# Altium footprint library TarabusLibrary.PcbLib: 591 footprints (part 9 of 37)
Each footprint in its own frame and in the unit in brackets; x right, y up, seen from the top. Pads: shape width x height; smd on the part's side, far side on the other; paste and mask are expansions set on the pad; w line width, h text height; cw(c..) or ccw(c..) is an arc to the next point about the centre after c.
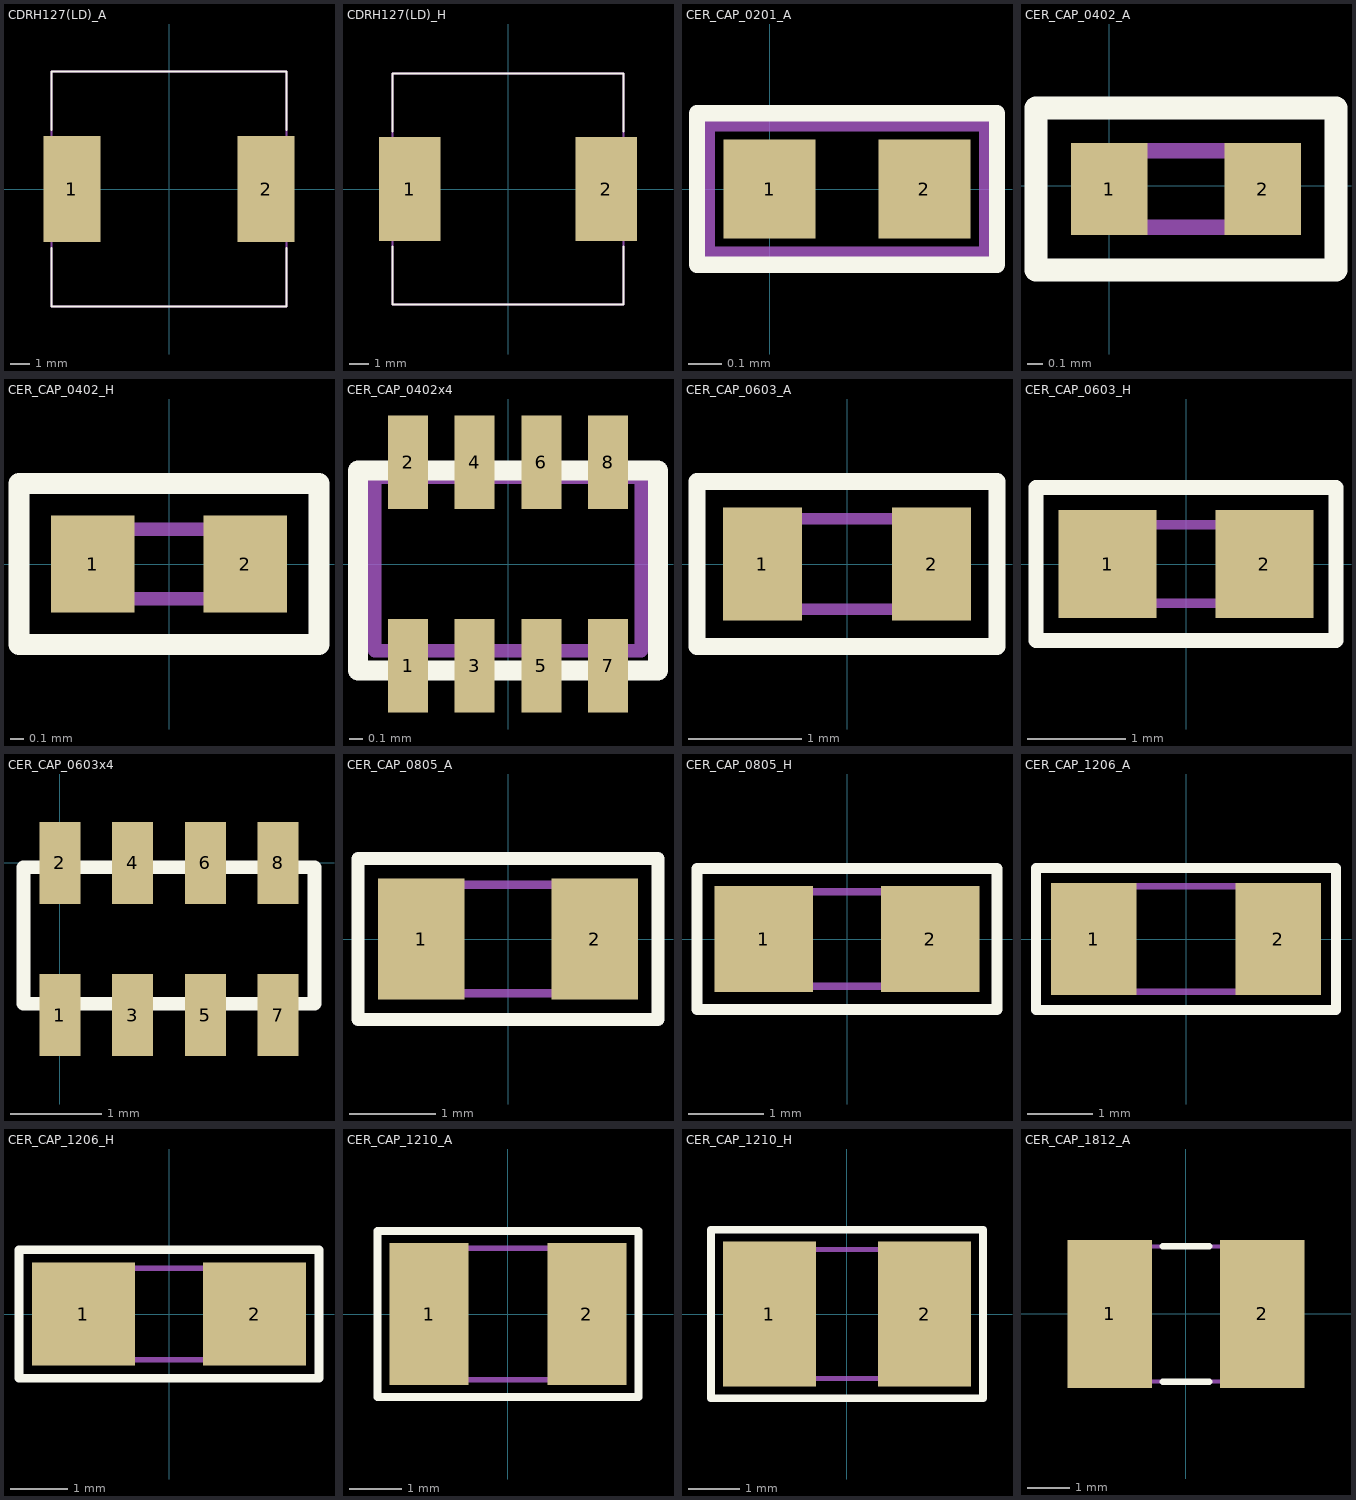
[diagram p8: the footprints below, top view; thin cyan lines are the x and y axes]

## CDRH127(LD)_A [mm]
height 8
pads (2):
  rect 2.9x5.4 smd mask+0: 1(-4.95,0) 2(4.95,0)
Top Overlay:
  lines w0.1: -6,-3 -6,-6 6,-6 6,-3 ; -6,3 -6,6 6,6 6,3
Mechanical 7:
  lines w0.1: -6,-6 -6,4.5 -6,6 6,6 6,-1.5 6,-6 -6,-6
Mechanical 10:
  text ".Comment" at -2,-7 h0.6
  text ".Designator" at 0,7 h0.8
3D body: height 2.8, standoff 0, extent -6,-6 6,6

## CDRH127(LD)_H [mm]
height 8
pads (2):
  rect 3.2x5.4 smd mask+0: 1(-5.1,0) 2(5.1,0)
Top Overlay:
  lines w0.1: -6,-3 -6,-6 6,-6 6,-3 ; -6,3 -6,6 6,6 6,3
Mechanical 7:
  lines w0.1: -6,-6 -6,4.5 -6,6 6,6 6,-1.5 6,-6 -6,-6
Mechanical 10:
  text ".Comment" at -2,-7 h0.6
  text ".Designator" at 0,7 h0.8
3D body: height 2.8, standoff 0, extent -6,-6 6,6

## CER_CAP_0201_A [mm]
pads (2):
  rect 0.28x0.3 smd mask+0.05: 1(0,0) 2(0.47,0)
Top Overlay:
  lines w0.05: -0.22,-0.23 -0.22,0.23 0.69,0.23 0.69,-0.23 -0.22,-0.23
Mechanical 7:
  lines w0.05: -0.19,-0.2 0.66,-0.2 0.66,0.2 -0.19,0.2 -0.19,-0.2
Mechanical 10:
  text ".Comment" at -0.08,-1.13 h0.6
  text ".Designator" at -0.08,0.73 h0.8
3D body: height 0.23, standoff 0, extent -0.06,-0.15 0.53,0.15

## CER_CAP_0402_A [mm]
pads (2):
  rect 0.5x0.6 smd: 1(0,-0.02) 2(1,-0.02)
Top Overlay:
  lines w0.15: -0.48,-0.55 1.48,-0.55 1.48,0.51 -0.48,0.51 -0.48,-0.55
Mechanical 7:
  lines w0.1: 0,-0.27 0,0.23 1,0.23 1,-0.27 0,-0.27
Mechanical 10:
  text ".Comment" at -0.08,-1.13 h0.6
  text ".Designator" at -0.08,0.73 h0.8
3D body: height 0.35, standoff 0, extent 0,-0.27 1,0.23

## CER_CAP_0402_H [mm]
height 0.55
pads (2):
  rect 0.6x0.7 smd: 1(-0.55,0) 2(0.55,0)
Top Overlay:
  lines w0.15: -1.08,-0.58 1.08,-0.58 1.08,0.58 -1.08,0.58 -1.08,-0.58
Mechanical 7:
  lines w0.1: -0.5,-0.25 -0.5,0.25 0.5,0.25 0.5,-0.25 -0.5,-0.25
Mechanical 10:
  text ".Designator" at -0.58,0.75 h0.8
  text ".Comment" at -0.6,-1.12 h0.6
3D body: height 0.55, standoff 0, extent -0.5,-0.25 0.5,0.25

## CER_CAP_0402x4 [mm]
height 0.55
pads (8):
  rect 0.3x0.7 smd: 1(-0.75,-0.763) 2(-0.75,0.763) 3(-0.25,-0.763) 4(-0.25,0.763) 5(0.25,-0.763) 6(0.25,0.763) 7(0.75,-0.763) 8(0.75,0.763)
Top Overlay:
  lines w0.15: -1.125,-0.8 -1.125,0.7 1.125,0.7 1.125,-0.8 -1.125,-0.8
Mechanical 7:
  lines w0.1: -1,-0.65 1,-0.65 1,0.65 -1,0.65 -1,-0.65
Mechanical 10:
  text ".Designator" at -1.95,1.4 h0.8
  text ".Comment" at -1.85,-1.8 h0.6

## CER_CAP_0603_A [mm]
height 0.9
pads (2):
  rect 0.7x1 smd: 1(-0.75,0) 2(0.75,0)
Top Overlay:
  lines w0.15: -1.33,-0.73 1.33,-0.73 1.33,0.73 -1.33,0.73 -1.33,-0.73
Mechanical 7:
  lines w0.1: -0.8,-0.4 -0.8,0.4 0.8,0.4 0.8,-0.4 -0.8,-0.4
Mechanical 10:
  text ".Designator" at -0.62,1 h0.8
  text ".Comment" at -0.75,-1.28 h0.6
3D body: height 0.9, standoff 0, extent -0.8,-0.4 0.8,0.4

## CER_CAP_0603_H [mm]
height 0.9
pads (2):
  rect 1x1.1 smd: 1(-0.8,0) 2(0.8,0)
Top Overlay:
  lines w0.15: -1.53,-0.78 -1.53,0.78 1.53,0.78 1.53,-0.78 -1.53,-0.78
Mechanical 7:
  lines w0.1: -0.8,-0.4 0.8,-0.4 0.8,0.4 -0.8,0.4 -0.8,-0.4
Mechanical 10:
  text ".Designator" at -0.62,1 h0.8
  text ".Comment" at -0.61,-1.33 h0.6
3D body: height 0.9, standoff 0, extent -0.8,-0.4 0.8,0.4

## CER_CAP_0603x4 [mm]
height 0.55
pads (8):
  rect 0.45x0.9 smd: 1(0,-1.675) 2(0,0) 3(0.8,-1.675) 4(0.8,0) 5(1.6,-1.675) 6(1.6,0) 7(2.4,-1.675) 8(2.4,0)
Top Overlay:
  lines w0.15: -0.4,-1.55 -0.4,-0.05 2.8,-0.05 2.8,-1.55 -0.4,-1.55
Mechanical 7:
  lines w0.1: -0.4,-1.55 2.8,-1.55 2.8,-0.05 -0.4,-0.05 -0.4,-1.55
Mechanical 10:
  text ".Designator" at -0.58,0.75 h0.8
  text ".Comment" at -0.56,-1.1 h0.6
3D body: height 0.55, standoff 0, extent -0.4,-1.55 2.8,-0.05

## CER_CAP_0805_A [mm]
height 1.3
pads (2):
  rect 1x1.4 smd: 1(-1,0) 2(1,0)
Top Overlay:
  lines w0.15: -1.73,-0.93 1.73,-0.93 1.73,0.93 -1.73,0.93 -1.73,-0.93
Mechanical 7:
  lines w0.1: -1,-0.625 -1,0.625 1,0.625 1,-0.625 -1,-0.625
Mechanical 10:
  text ".Comment" at -0.59,-1.6 h0.6
  text ".Designator" at -0.46,1.29 h0.8
3D body: height 1.3, standoff 0, extent -1,-0.625 1,0.625

## CER_CAP_0805_H [mm]
height 1.3
pads (2):
  rect 1.3x1.4 smd: 1(-1.1,0) 2(1.1,0)
Top Overlay:
  lines w0.15: -1.98,-0.93 -1.98,0.93 1.98,0.93 1.98,-0.93 -1.98,-0.93
Mechanical 7:
  lines w0.1: -1,-0.625 1,-0.625 1,0.625 -1,0.625 -1,-0.625
Mechanical 10:
  text ".Designator" at -0.47,1.37 h0.8
  text ".Comment" at -0.45,-1.62 h0.6
3D body: height 1.3, standoff 0, extent -1,-0.625 1,0.625

## CER_CAP_1206_A [mm]
height 1.5
pads (2):
  rect 1.3x1.7 smd: 1(-1.4,0) 2(1.4,0)
Top Overlay:
  lines w0.15: -2.28,-1.08 -2.28,1.08 2.28,1.08 2.28,-1.08 -2.28,-1.08
Mechanical 7:
  lines w0.1: -1.6,-0.8 1.6,-0.8 1.6,0.8 -1.6,0.8 -1.6,-0.8
Mechanical 10:
  text ".Comment" at -0.71,-1.67 h0.6
  text ".Designator" at -0.55,1.31 h0.8
3D body: height 1.5, standoff 0, extent -1.6,-0.8 1.6,0.8

## CER_CAP_1206_H [mm]
height 1.5
pads (2):
  rect 1.8x1.8 smd: 1(-1.5,0) 2(1.5,0)
Top Overlay:
  lines w0.15: -2.63,-1.13 -2.63,1.13 2.63,1.13 2.63,-1.13 -2.63,-1.13
Mechanical 7:
  lines w0.1: -1.6,-0.8 1.6,-0.8 1.6,0.8 -1.6,0.8 -1.6,-0.8
Mechanical 10:
  text ".Designator" at -0.55,1.31 h0.8
  text ".Comment" at -0.57,-1.8 h0.6
3D body: height 1.5, standoff 0, extent -1.6,-0.8 1.6,0.8

## CER_CAP_1210_A [mm]
height 2.5
pads (2):
  rect 1.5x2.7 smd: 1(-1.5,0) 2(1.5,0)
Top Overlay:
  lines w0.15: -2.48,-1.58 2.48,-1.58 2.48,1.58 -2.48,1.58 -2.48,-1.58
Mechanical 7:
  lines w0.1: -1.6,-1.25 -1.6,1.25 1.6,1.25 1.6,-1.25 -1.6,-1.25
Mechanical 10:
  text ".Comment" at -0.74,-2.23 h0.6
  text ".Designator" at -0.71,1.89 h0.8
3D body: height 2.5, standoff 0, extent -1.6,-1.25 1.6,1.25

## CER_CAP_1210_H [mm]
height 2.5
pads (2):
  rect 1.8x2.8 smd: 1(-1.5,0) 2(1.5,0)
Top Overlay:
  lines w0.15: -2.63,-1.63 -2.63,1.63 2.63,1.63 2.63,-1.63 -2.63,-1.63
Mechanical 7:
  lines w0.1: -1.6,-1.25 1.6,-1.25 1.6,1.25 -1.6,1.25 -1.6,-1.25
Mechanical 10:
  text ".Designator" at -0.71,1.89 h0.8
  text ".Comment" at -0.69,-2.29 h0.6
3D body: height 2.5, standoff 0, extent -1.6,-1.25 1.6,1.25

## CER_CAP_1812_A [mm]
height 1.7
pads (2):
  rect 2x3.5 smd: 1(-1.8,0) 2(1.8,0)
Top Overlay:
  lines w0.15: -0.55,-1.6 0.55,-1.6 ; -0.55,1.6 0.55,1.6
Mechanical 7:
  lines w0.1: -2.25,-1.6 -2.25,1.6 2.25,1.6 2.25,-1.6 -2.25,-1.6
Mechanical 10:
  text ".Designator" at -0.62,2.14 h0.8
  text ".Comment" at -0.52,-2.51 h0.6
3D body: height 1.7, standoff 0, extent -2.25,-1.6 2.25,1.6